# Altium footprint library OT Library.PcbLib: 396 footprints (part 8 of 25)
Each footprint in its own frame and in the unit in brackets; x right, y up, seen from the top. Pads: shape width x height; smd on the part's side, far side on the other; paste and mask are expansions set on the pad; w line width, h text height; cw(c..) or ccw(c..) is an arc to the next point about the centre after c.
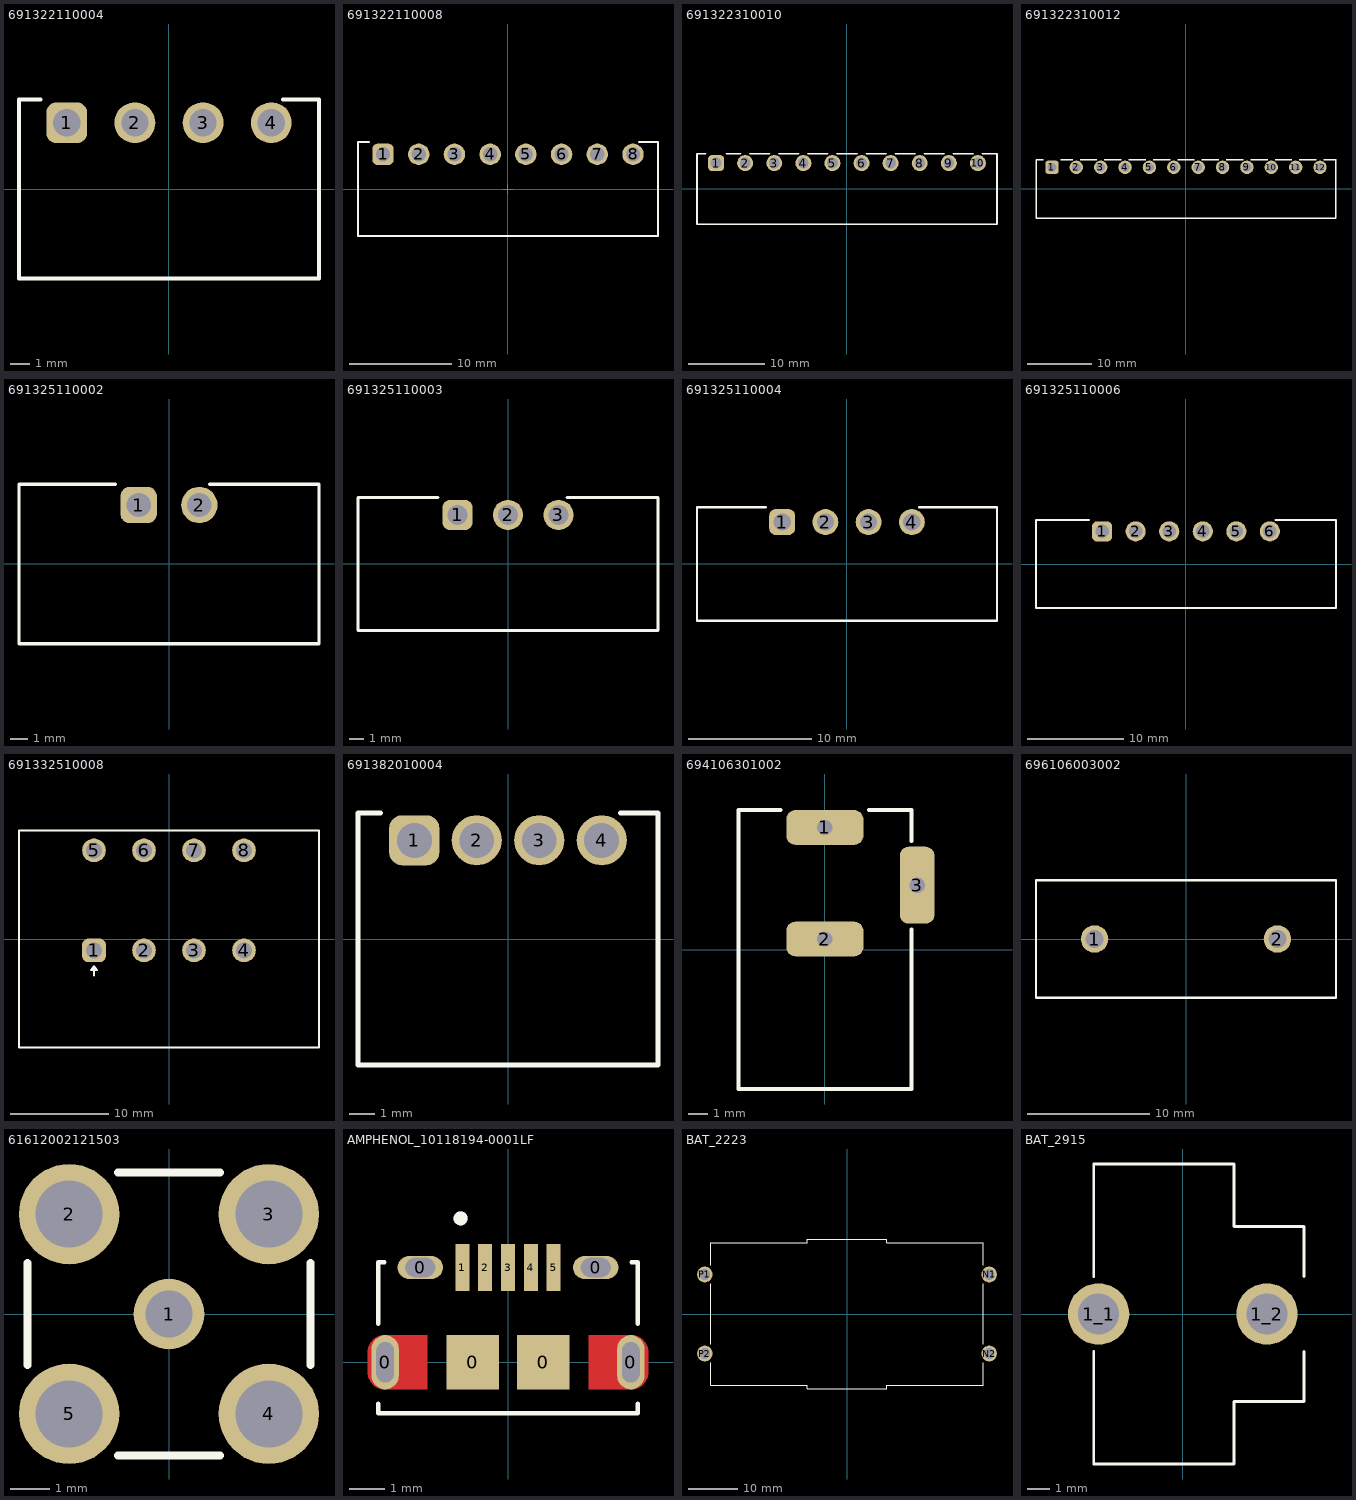
[diagram p7: the footprints below, top view; thin cyan lines are the x and y axes]

## 691322110004 [mm] "Horizontal PCB Header, pitch 3.5mm, 04p"
height 7
pads (4):
  rrect50% 2.1x2.1 hole 1.4: 1(-5.25,3.4)
  round 2.1 hole 1.4: 2(-1.75,3.4) 3(1.75,3.4) 4(5.25,3.4)
Top Overlay:
  lines w0.2: -6.6,4.6 -7.7,4.6 -7.7,-4.6 7.7,-4.6 7.7,4.6 5.85,4.6
3D body: height 7.3, standoff -3.4, extent -7.7,-4.6 7.7,4.6

## 691322110008 [mm] "Horizontal PCB Header, pitch 3.5mm, 08p"
height 7
pads (8):
  rrect50% 2.1x2.1 hole 1.4: 1(-12.25,3.4)
  round 2.1 hole 1.4: 2(-8.75,3.4) 3(-5.25,3.4) 4(-1.75,3.4) 5(1.75,3.4) 6(5.25,3.4) 7(8.75,3.4) 8(12.25,3.4)
Top Overlay:
  lines w0.2: -13.6,4.6 -14.7,4.6 -14.7,-4.6 14.7,-4.6 14.7,4.6 12.85,4.6
Top Component Center:
  lines w0.05: -0.5,0 0.5,0 ; 0,-0.5 0,0.5
3D body: height 7.3, standoff -3.4, extent -14.7,-4.6 14.7,4.6

## 691322310010 [mm] "Horizontal PCB Header, pitch 3.81mm, 10p"
height 7
pads (10):
  rrect50% 2.1x2.1 hole 1.4: 1(-17.145,3.4)
  round 2.1 hole 1.4: 2(-13.335,3.4) 3(-9.525,3.4) 4(-5.715,3.4) 5(-1.905,3.4) 6(1.905,3.4) 7(5.715,3.4) 8(9.525,3.4) 9(13.335,3.4) 10(17.145,3.4)
Top Overlay:
  lines w0.2: -18.495,4.6 -19.645,4.6 -19.645,-4.6 19.645,-4.6 19.645,4.6 17.735,4.6 ; -15.795,4.6 -13.925,4.6 ; -12.745,4.6 -10.115,4.6 ; -8.935,4.6 -6.305,4.6 ; -5.125,4.6 -2.495,4.6 ; -1.315,4.6 1.315,4.6 ; 2.495,4.6 5.125,4.6 ; 6.305,4.6 8.935,4.6 ; 10.115,4.6 12.745,4.6 ; 13.925,4.6 16.555,4.6
3D body: height 7.25, standoff -3.45, extent -19.645,-4.6 19.645,4.6

## 691322310012 [mm] "Horizontal PCB Header, pitch 3.81mm, 12p"
height 7
pads (12):
  rrect50% 2.1x2.1 hole 1.4: 1(-20.955,3.4)
  round 2.1 hole 1.4: 2(-17.145,3.4) 3(-13.335,3.4) 4(-9.525,3.4) 5(-5.715,3.4) 6(-1.905,3.4) 7(1.905,3.4) 8(5.715,3.4) 9(9.525,3.4) 10(13.335,3.4) 11(17.145,3.4) 12(20.955,3.4)
Top Overlay:
  lines w0.2: -22.305,4.6 -23.455,4.6 -23.455,-4.6 23.455,-4.6 23.455,4.6 21.545,4.6 ; -19.605,4.6 -17.735,4.6 ; -16.555,4.6 -13.925,4.6 ; -12.745,4.6 -10.115,4.6 ; -8.935,4.6 -6.305,4.6 ; -5.125,4.6 -2.495,4.6 ; -1.315,4.6 1.315,4.6 ; 2.495,4.6 5.125,4.6 ; 6.305,4.6 8.935,4.6 ; 10.115,4.6 12.745,4.6 ; 13.925,4.6 16.555,4.6 ; 17.735,4.6 20.365,4.6
3D body: height 7.25, standoff -3.45, extent -23.455,-4.6 23.455,4.6

## 691325110002 [mm] "Horizontal PCB Header with Flanges, pitch 3.5mm, 02p"
height 7.2
pads (2):
  rrect50% 2.1x2.1 hole 1.4: 1(-1.75,3.4)
  round 2.1 hole 1.4: 2(1.75,3.4)
Top Overlay:
  lines w0.2: -3.1,4.6 -8.65,4.6 -8.65,-4.6 8.65,-4.6 8.65,4.6 2.35,4.6
3D body: height 7.3, standoff -3.5, extent -8.65,-4.6 8.65,4.6

## 691325110003 [mm] "Horizontal PCB Header with Flanges, pitch 3.5mm, 03p"
height 7.2
pads (3):
  rrect50% 2.1x2.1 hole 1.4: 1(-3.5,3.4)
  round 2.1 hole 1.4: 2(0,3.4) 3(3.5,3.4)
Top Overlay:
  lines w0.2: -4.85,4.6 -10.4,4.6 -10.4,-4.6 10.4,-4.6 10.4,4.6 4.1,4.6
3D body: height 7.3, standoff -3.5, extent -10.4,-4.6 10.4,4.6

## 691325110004 [mm] "Horizontal PCB Header with Flanges, pitch 3.5mm, 04p"
height 7.2
pads (4):
  rrect50% 2.1x2.1 hole 1.4: 1(-5.25,3.4)
  round 2.1 hole 1.4: 2(-1.75,3.4) 3(1.75,3.4) 4(5.25,3.4)
Top Overlay:
  lines w0.2: -6.6,4.6 -12.15,4.6 -12.15,-4.6 12.15,-4.6 12.15,4.6 5.85,4.6
3D body: height 7.3, standoff -3.5, extent -12.15,-4.6 12.15,4.6

## 691325110006 [mm] "Horizontal PCB Header with Flanges, pitch 3.5mm, 06p"
height 7.2
pads (6):
  rrect50% 2.1x2.1 hole 1.4: 1(-8.75,3.4)
  round 2.1 hole 1.4: 2(-5.25,3.4) 3(-1.75,3.4) 4(1.75,3.4) 5(5.25,3.4) 6(8.75,3.4)
Top Overlay:
  lines w0.2: -10.1,4.6 -15.65,4.6 -15.65,-4.6 15.65,-4.6 15.65,4.6 9.35,4.6
3D body: height 7.3, standoff -3.5, extent -15.65,-4.6 15.65,4.6

## 691332510008 [mm] "5,08mm - PCB - Dual row - Horizontal - Flanges - 08p"
height 28.8
pads (8):
  rrect50% 2.4x2.4 hole 1.6: 1(-7.62,-1.16)
  round 2.4 hole 1.6: 2(-2.54,-1.16) 3(2.54,-1.16) 4(7.62,-1.16) 5(-7.62,9) 6(-2.54,9) 7(2.54,9) 8(7.62,9)
Top Overlay:
  lines w0.2: -7.62,-3.708 -7.62,-2.769 ; -7.62,-2.769 -7.315,-3.15 -7.925,-3.15 -7.62,-2.769 ; -15.24,-11 -15.24,11 15.24,11 15.24,-11 -15.24,-11
3D body: height 28.85, standoff -3.95, extent -15.24,-11 15.24,11

## 691382010004 [mm] "Horizontal PCB Header, pitch 2.5mm, 04p"
height 8.1
pads (4):
  rrect50% 2x2 hole 1.4: 1(-3.75,3.95)
  round 2 hole 1.4: 2(-1.25,3.95) 3(1.25,3.95) 4(3.75,3.95)
Top Overlay:
  lines w0.2: -5.1,5.05 -6,5.05 -6,-5.05 6,-5.05 6,5.05 4.5,5.05
3D body: height 8.15, standoff -3.45, extent -6,-5.05 6,5.05

## 694106301002 [mm] "DC Power Jack Right Angled(6.4)"
height 10.7
pads (3):
  rrect50% 4x1.8 hole 0.8 square: 1(0,6.35) 2(0,0.55)
  rrect50% 1.8x4 hole 0.8 square: 3(4.8,3.35)
Top Overlay:
  lines w0.2: -2.3,7.25 -4.5,7.25 -4.5,-7.25 4.5,-7.25 4.5,1.05 ; 2.3,7.25 4.5,7.25 4.5,5.65
3D body: height 10.75, standoff -3.75, extent -4.5,-7.25 5,7.25

## 696106003002 [mm]
pads (2):
  round 2.25 hole 1.5 mask+0.102: 1(-7.5,0) 2(7.5,0)
Top Overlay:
  lines w0.2: -12.3,-4.8 -12.3,4.8 12.3,4.8 12.3,-4.8 -12.3,-4.8
3D body: height 22.7, standoff -4.5, extent -12.2,-4.701 12.2,4.699

## 61612002121503 [mm]
pads (5):
  round 1.8 hole 1.2: 1(0,0)
  round 2.55 hole 1.7: 2(-2.54,2.54) 3(2.54,2.54) 4(2.54,-2.54) 5(-2.54,-2.54)
Top Overlay:
  lines w0.2: -3.6,-1.3 -3.6,1.3 ; -1.3,-3.6 1.3,-3.6 ; -1.3,3.6 1.3,3.6 ; 3.6,-1.3 3.6,1.3
3D body: height 7.56, standoff -3.94, extent -3.5,-3.5 3.5,3.5

## AMPHENOL_10118194-0001LF [mm]
pads (11):
  oval 0.775x1.55 hole 0.5 slot 1.15 at 90 deg: 0(-3.5,0) 0(3.5,0)
  oval 1.3x0.65 hole 0.55 slot 0.85 at 0 deg: 0(-2.5,2.7) 0(2.5,2.7)
  rect 1.5x1.55 smd: 0(-1,0) 0(1,0)
  rect 0.4x1.35 smd: 1(-1.3,2.7) 2(-0.65,2.7) 3(0,2.7) 4(0.65,2.7) 5(1.3,2.7)
Top Layer:
  region: 191 vertices and 0 holes, not listed, extent 2.3,-0.78 4,0.775
  region: 191 vertices and 0 holes, not listed, extent -4,-0.775 -2.3,0.78
Top Overlay:
  circle w0.2: c-1.35,4.1 r0.1
  lines w0.127: -3.7,-1.18 -3.7,-1.45 3.7,-1.45 3.7,-1.18 ; -3.7,1.095 -3.7,2.85 -3.52,2.85 ; 3.52,2.85 3.7,2.85 3.7,1.095
Top Paste:
  drawing of 6 lines, arcs and shapes, not listed
Top Solder:
  region: 3.626,0.874 3.652,0.872 3.678,0.869 3.704,0.864 3.729,0.858 3.755,0.851 3.779,0.842 3.803,0.832 3.827,0.821 3.85,0.808 3.872,0.794 3.894,0.78 3.915,0.764 3.935,0.747 3.954,0.729 3.972,0.71 3.989,0.69 4.005,0.669 4.019,0.647 4.033,0.625 4.046,0.602 4.057,0.578 4.067,0.554 4.076,0.53 4.083,0.504 4.089,0.479 4.094,0.453 4.097,0.427 4.099,0.401 4.1,0.375 4.1,-0.375 4.099,-0.401 4.097,-0.427 4.094,-0.453 4.089,-0.479 4.083,-0.504 4.076,-0.53 4.067,-0.554 4.057,-0.578 4.046,-0.602 4.033,-0.625 4.019,-0.647 4.005,-0.669 3.989,-0.69 3.972,-0.71 3.954,-0.729 3.935,-0.747 3.915,-0.764 3.894,-0.78 3.872,-0.794 3.85,-0.808 3.827,-0.821 3.803,-0.832 3.779,-0.842 3.755,-0.851 3.729,-0.858 3.704,-0.864 3.678,-0.869 3.652,-0.872 3.626,-0.874 3.6,-0.875 2.2,-0.875 2.2,0.875 3.6,0.875
  region: -2.2,-0.875 -3.6,-0.875 -3.626,-0.874 -3.652,-0.872 -3.678,-0.869 -3.704,-0.864 -3.729,-0.858 -3.755,-0.851 -3.779,-0.842 -3.803,-0.832 -3.827,-0.821 -3.85,-0.808 -3.872,-0.794 -3.894,-0.78 -3.915,-0.764 -3.935,-0.747 -3.954,-0.729 -3.972,-0.71 -3.989,-0.69 -4.005,-0.669 -4.019,-0.647 -4.033,-0.625 -4.046,-0.602 -4.057,-0.578 -4.067,-0.554 -4.076,-0.53 -4.083,-0.504 -4.089,-0.479 -4.094,-0.453 -4.097,-0.427 -4.099,-0.401 -4.1,-0.375 -4.1,0.375 -4.099,0.401 -4.097,0.427 -4.094,0.453 -4.089,0.479 -4.083,0.504 -4.076,0.53 -4.067,0.554 -4.057,0.578 -4.046,0.602 -4.033,0.625 -4.019,0.647 -4.005,0.669 -3.989,0.69 -3.972,0.71 -3.954,0.729 -3.935,0.747 -3.915,0.764 -3.894,0.78 -3.872,0.794 -3.85,0.808 -3.827,0.821 -3.803,0.832 -3.779,0.842 -3.755,0.851 -3.729,0.858 -3.704,0.864 -3.678,0.869 -3.652,0.872 -3.626,0.874 -3.6,0.875 -2.2,0.875
3D Top:
  circle w0.2: c-1.35,4.1 r0.1
  text "PCB END" at -1.95,-2.1 h0.5
3D body: height 2.67, standoff -0.6, extent -4.025,-2.68 4.025,2.85

## BAT_2223 [mm]
height 14.93
pads (4):
  round 3.146 hole 2.13: N1(28.575,7.94) N2(28.575,-7.94) P1(-28.575,7.94) P2(-28.575,-7.94)
Top Overlay:
  lines w0.127: -27.38,-9.833 -27.38,-14.29 -7.94,-14.29 -7.94,-15.05 7.94,-15.05 7.94,-14.29 27.38,-14.29 27.38,-9.833 ; -27.38,-6.047 -27.38,6.047 ; -27.38,9.833 -27.38,14.29 -7.94,14.29 -7.94,15.05 7.94,15.05 7.94,14.29 27.38,14.29 27.38,9.833 ; 27.38,-6.047 27.38,6.047
3D body: height 15.4, standoff -16.22, extent -30.268,-15.1 29.921,15.049

## BAT_2915 [mm]
height 15.21
pads (2):
  round 2.775 hole 1.85: 1_1(-3.81,0) 1_2(3.81,0)
Top Overlay:
  lines w0.127: -4.03,-1.701 -4.03,-6.79 2.32,-6.79 2.32,-3.96 5.49,-3.96 5.49,-1.701 ; -4.03,1.701 -4.03,6.79 2.32,6.79 2.32,3.96 5.49,3.96 5.49,1.701
3D body: height 15.21, standoff -3.63, extent -4.107,-6.833 5.799,6.834